# Altium footprint library IC.PCBLIB: 359 footprints (part 10 of 23)
Each footprint in its own frame and in the unit in brackets; x right, y up, seen from the top. Pads: shape width x height; smd on the part's side, far side on the other; paste and mask are expansions set on the pad; w line width, h text height; cw(c..) or ccw(c..) is an arc to the next point about the centre after c.
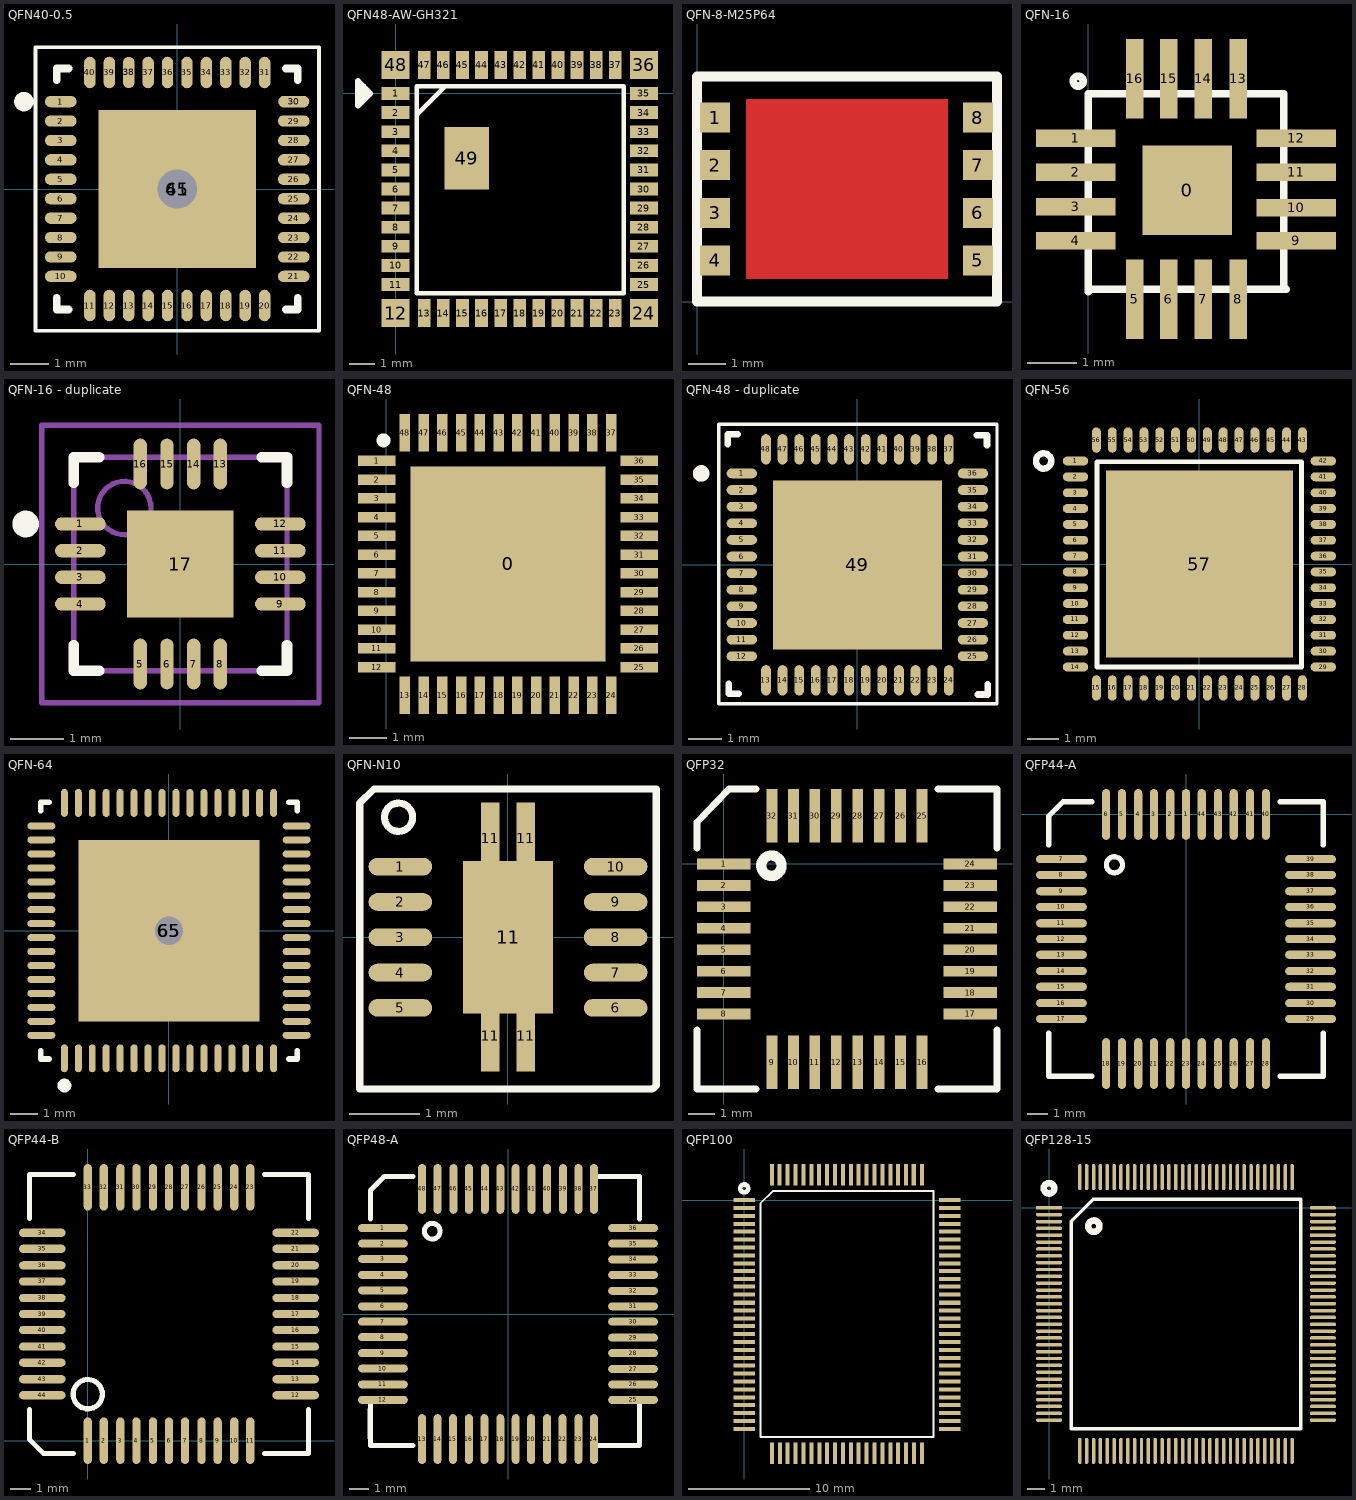
[diagram p9: the footprints below, top view; thin cyan lines are the x and y axes]

## QFN40-0.5 [mm]
pads (42):
  oval 0.813x0.292 smd: 1(-3,2.25) 2(-3,1.75) 3(-3,1.25) 4(-3,0.75) 5(-3,0.25) 6(-3,-0.25) 7(-3,-0.75) 8(-3,-1.25) 9(-3,-1.75) 10(-3,-2.25) 21(3,-2.25) 22(3,-1.75) 23(3,-1.25) 24(3,-0.75) 25(3,-0.25) 26(3,0.25) 27(3,0.75) 28(3,1.25) 29(3,1.75)
  oval 0.292x0.813 smd: 11(-2.25,-3) 12(-1.75,-3) 13(-1.25,-3) 14(-0.75,-3) 15(-0.25,-3) 16(0.25,-3) 17(0.75,-3) 18(1.25,-3) 19(1.75,-3) 20(2.25,-3) 31(2.25,3) 32(1.75,3) 33(1.25,3) 34(0.75,3) 35(0.25,3) 36(-0.25,3) 37(-0.75,3) 39(-1.75,3) 40(-2.25,3)
  oval 0.8x0.3 smd: 30(3,2.25)
  oval 0.3x0.8 smd: 38(-1.25,3)
  rect 4.064x4.064 smd: 41(0,0)
  oct 1.524x1.524 hole 1.016: 65(0,0)
TopOverlay:
  circle w0.25: c-3.95,2.25 r0.125
  lines w0.1: -3.65,-3.65 -3.65,3.65 3.65,3.65 3.65,-3.65 -3.65,-3.65
  lines w0.2: -3.1,-2.8 -3.1,-3.1 -2.8,-3.1 ; -3.1,2.8 -3.1,3.1 -2.8,3.1 ; 2.8,-3.1 3.1,-3.1 3.1,-2.8 ; 2.8,3.1 3.1,3.1 3.1,2.8
TopSolder:
  region: 1.016,0.508 1.016,-0.508 2.032,-0.508 2.032,0.508
  region: 0.508,-1.016 -0.508,-1.016 -0.508,-2.032 0.508,-2.032
  region: -1.016,-0.508 -1.016,0.508 -2.032,0.508 -2.032,-0.508
  rectangle: -0.508,1.016 0.508,2.032
  region: 0.711,2.032 0.711,0.711 2.032,0.711 2.032,2.032
  region: 2.032,-0.711 0.711,-0.711 0.711,-2.032 2.032,-2.032
  region: -0.711,-2.032 -0.711,-0.711 -2.032,-0.711 -2.032,-2.032
  rectangle: -2.032,0.711 -0.711,2.032

## QFN48-AW-GH321 [mm]
height 1.016
pads (49):
  rect 1.1x0.5 smd: 1(0,0) 2(0,-0.75) 3(0,-1.5) 4(0,-2.25) 5(0,-3) 6(0,-3.75) 7(0,-4.5) 8(0,-5.25) 9(0,-6) 10(0,-6.75) 11(0,-7.5) 25(9.75,-7.5) 26(9.75,-6.75) 27(9.75,-6) 28(9.75,-5.25) 29(9.75,-4.5) 30(9.75,-3.75) 31(9.75,-3) 32(9.75,-2.25) 33(9.75,-1.5) 34(9.75,-0.75) 35(9.75,0)
  rect 1.1x1.1 smd: 12(0,-8.625) 24(9.75,-8.625) 36(9.75,1.125) 48(0,1.125)
  rect 0.5x1.1 smd: 13(1.125,-8.625) 14(1.875,-8.625) 15(2.625,-8.625) 16(3.375,-8.625) 17(4.125,-8.625) 18(4.875,-8.625) 19(5.625,-8.625) 20(6.375,-8.625) 21(7.125,-8.625) 22(7.875,-8.625) 23(8.625,-8.625) 37(8.625,1.125) 38(7.875,1.125) 39(7.125,1.125) 40(6.375,1.125) 41(5.625,1.125) 42(4.875,1.125) 43(4.125,1.125) 44(3.375,1.125) 45(2.625,1.125) 46(1.875,1.125) 47(1.125,1.125)
  rect 1.75x2.47 smd: 49(2.797,-2.544)
TopOverlay:
  lines w0.178: -0.179,-8.55 0.075,-8.55 ; -0.179,1.05 0.074,1.05 ; 0.075,-8.804 0.075,-8.551 ; 0.075,1.05 0.075,1.304 ; 0.837,-0.831 1.956,0.288 ; 9.675,-8.804 9.675,-8.55 ; 9.675,1.051 9.929,1.051 ; 9.675,1.052 9.675,1.305 ; 9.676,-8.55 9.929,-8.55 ; 0.837,-7.84 8.965,-7.84 8.965,0.288 0.837,0.288 0.837,-7.84
  lines w0.229: -1.258,-0.215 -1.258,0.268 ; -1.473,-0.483 -1.473,0.483 -0.991,0 -1.473,-0.483

## QFN-8-M25P64 [mm]
pads (8):
  rect 0.8x0.8 smd: 1(0.484,4.905) 2(0.484,3.635) 3(0.484,2.365) 4(0.484,1.095) 5(7.493,1.095) 6(7.493,2.365) 7(7.493,3.635) 8(7.493,4.905)
TopLayer:
  rectangle: 1.3,0.6 6.7,5.4
TopOverlay:
  lines w0.254: 0,0 8,0 8,6 0,6 0,0

## QFN-16 [mm]
pads (17):
  rect 1.8x1.8 smd: 0(2,18.35)
  rect 1.6x0.35 smd: 1(-0.25,19.4) 2(-0.25,18.71) 3(-0.25,18.02) 4(-0.25,17.33) 9(4.2,17.33) 10(4.2,18) 11(4.2,18.71) 12(4.2,19.4)
  rect 0.35x1.6 smd: 5(0.94,16.15) 6(1.63,16.15) 7(2.32,16.15) 8(3.03,16.15) 13(3.03,20.6) 14(2.32,20.6) 15(1.63,20.6) 16(0.94,20.6)
TopOverlay:
  circle w0.152: c-0.2,20.55 r0.1
  lines w0.152: 0,16.3 0.05,16.35 4,16.35 3.95,16.4 3.95,20.3 0,20.3 0,16.3

## QFN-16 - duplicate [mm]
height 1
pads (17):
  oval 0.95x0.25 smd: 1(-1.875,0.75) 2(-1.875,0.25) 3(-1.875,-0.25) 4(-1.875,-0.75) 9(1.875,-0.75) 10(1.875,-0.25) 11(1.875,0.25) 12(1.875,0.75)
  oval 0.25x0.95 smd: 5(-0.75,-1.875) 6(-0.25,-1.875) 7(0.25,-1.875) 8(0.75,-1.875) 13(0.75,1.875) 14(0.25,1.875) 15(-0.25,1.875) 16(-0.75,1.875)
  rect 2x2 smd: 17(0,0)
TopOverlay:
  circle w0.25: c-2.9,0.75 r0.125
  lines w0.2: -2,-1.525 -2,-2 -1.525,-2 ; -2,1.525 -2,2 -1.525,2 ; 1.525,-2 2,-2 2,-1.525 ; 1.525,2 2,2 2,1.525
Mechanical13:
  circle w0.1: c-1.05,1.05 r0.5
  lines w0.1: -2,-2 2,-2 2,2 -2,2 -2,-2
Mechanical15:
  lines w0.1: -0.5,0 0.5,0 ; 0,-0.5 0,0.5 ; -2.6,-2.6 2.6,-2.6 2.6,2.6 -2.6,2.6 -2.6,-2.6
3D body: height 1, standoff 0.02, extent -2,-2 2,2

## QFN-48 [mm]
pads (49):
  rect 5.2x5.2 smd: 0(3.25,-8.25)
  rect 1x0.28 smd: 1(-0.25,-5.5) 2(-0.25,-6) 3(-0.25,-6.5) 4(-0.25,-7) 5(-0.25,-7.5) 6(-0.25,-8) 7(-0.25,-8.5) 8(-0.25,-9) 9(-0.25,-9.5) 10(-0.25,-10) 11(-0.25,-10.5) 12(-0.25,-11) 25(6.75,-11) 26(6.75,-10.5) 27(6.75,-10) 28(6.75,-9.5) 29(6.75,-9) 30(6.75,-8.5) 31(6.75,-8) 32(6.75,-7.5) 33(6.75,-7) 34(6.75,-6.5) 35(6.75,-6) 36(6.75,-5.5)
  rect 0.28x1 smd: 13(0.5,-11.75) 14(1,-11.75) 15(1.5,-11.75) 16(2,-11.75) 17(2.5,-11.75) 18(3,-11.75) 19(3.5,-11.75) 20(4,-11.75) 21(4.5,-11.75) 22(5,-11.75) 23(5.5,-11.75) 24(6,-11.75) 37(6,-4.75) 38(5.5,-4.75) 39(5,-4.75) 40(4.5,-4.75) 41(4,-4.75) 42(3.5,-4.75) 43(3,-4.75) 44(2.5,-4.75) 45(2,-4.75) 46(1.5,-4.75) 47(1,-4.75) 48(0.5,-4.75)
TopOverlay:
  circle w0.23: c-0.07,-4.953 r0.07

## QFN-48 - duplicate [mm]
pads (49):
  oval 0.913x0.292 smd: 1(-3.475,2.75) 2(-3.475,2.25) 3(-3.475,1.75) 4(-3.475,1.25) 5(-3.475,0.75) 6(-3.475,0.25) 7(-3.475,-0.25) 8(-3.475,-0.75) 9(-3.475,-1.25) 10(-3.475,-1.75) 11(-3.475,-2.25) 12(-3.475,-2.75) 25(3.475,-2.75) 26(3.475,-2.25) 27(3.475,-1.75) 28(3.475,-1.25) 29(3.475,-0.75) 30(3.475,-0.25) 31(3.475,0.25) 32(3.475,0.75) 33(3.475,1.25) 34(3.475,1.75) 35(3.475,2.25) 36(3.475,2.75)
  oval 0.292x0.913 smd: 13(-2.75,-3.475) 14(-2.25,-3.475) 15(-1.75,-3.475) 16(-1.25,-3.475) 17(-0.75,-3.475) 18(-0.25,-3.475) 19(0.25,-3.475) 20(0.75,-3.475) 21(1.25,-3.475) 22(1.75,-3.475) 23(2.25,-3.475) 24(2.75,-3.475) 37(2.75,3.475) 38(2.25,3.475) 39(1.75,3.475) 40(1.25,3.475) 41(0.75,3.475) 42(0.25,3.475) 43(-0.25,3.475) 44(-0.75,3.475) 45(-1.25,3.475) 46(-1.75,3.475) 47(-2.25,3.475) 48(-2.75,3.475)
  rect 5.08x5.08 smd: 49(0,0)
TopOverlay:
  circle w0.25: c-4.7,2.75 r0.125
  lines w0.1: -4.175,-4.175 -4.175,4.225 4.2,4.225 4.2,-4.175 -4.175,-4.175
  lines w0.2: -3.9,3.625 -3.9,3.925 -3.6,3.925 ; -3.875,-3.575 -3.875,-3.875 -3.575,-3.875 ; 3.6,3.9 3.9,3.9 3.9,3.6 ; 3.625,-3.9 3.925,-3.9 3.925,-3.6
TopSolder:
  rectangle: -0.762,-0.762 0.762,0.762
  rectangle: -2.54,-0.762 -1.016,0.762
  rectangle: -2.54,1.016 -1.016,2.54
  region: -1.016,-2.54 -1.016,-1.016 -2.54,-1.016 -2.54,-2.54
  region: 0.762,-2.54 0.762,-1.016 -0.762,-1.016 -0.762,-2.54
  region: 2.54,-1.016 1.016,-1.016 1.016,-2.54 2.54,-2.54
  region: 2.54,0.762 1.016,0.762 1.016,-0.762 2.54,-0.762
  region: 1.016,2.54 1.016,1.016 2.54,1.016 2.54,2.54
  region: -0.762,2.54 -0.762,1.016 0.762,1.016 0.762,2.54

## QFN-56 [mm]
pads (57):
  oval 0.8x0.28 smd: 1(-3.91,3.25) 2(-3.91,2.75) 3(-3.91,2.25) 4(-3.91,1.75) 5(-3.91,1.25) 6(-3.91,0.75) 7(-3.91,0.25) 8(-3.91,-0.25) 9(-3.91,-0.75) 10(-3.91,-1.25) 11(-3.91,-1.75) 12(-3.91,-2.25) 13(-3.91,-2.75) 14(-3.91,-3.25) 29(3.91,-3.25) 30(3.91,-2.75) 31(3.91,-2.25) 32(3.91,-1.75) 33(3.91,-1.25) 34(3.91,-0.75) 35(3.91,-0.25) 36(3.91,0.25) 37(3.91,0.75) 38(3.91,1.25) 39(3.91,1.75) 40(3.91,2.25) 41(3.91,2.75) 42(3.91,3.25)
  oval 0.28x0.8 smd: 15(-3.25,-3.91) 16(-2.75,-3.91) 17(-2.25,-3.91) 18(-1.75,-3.91) 19(-1.25,-3.91) 20(-0.75,-3.91) 21(-0.25,-3.91) 22(0.25,-3.91) 23(0.75,-3.91) 24(1.25,-3.91) 25(1.75,-3.91) 26(2.25,-3.91) 27(2.75,-3.91) 28(3.25,-3.91) 43(3.25,3.91) 44(2.75,3.91) 45(2.25,3.91) 46(1.75,3.91) 47(1.25,3.91) 48(0.75,3.91) 49(0.25,3.91) 50(-0.25,3.91) 51(-0.75,3.91) 52(-1.25,3.91) 53(-1.75,3.91) 54(-2.25,3.91) 55(-2.75,3.91) 56(-3.25,3.91)
  rect 5.9x5.9 smd: 57(0,0)
TopOverlay:
  circle w0.203: c-4.915,3.251 r0.241
  lines w0.152: -3.226,-3.251 3.226,-3.251 3.226,3.226 -3.226,3.226 -3.226,-3.251

## QFN-64 [mm]
height 1.016
pads (66):
  oval 0.25x1 smd: 1(-3.75,-4.575) 2(-3.25,-4.575) 3(-2.75,-4.575) 4(-2.25,-4.575) 5(-1.75,-4.575) 6(-1.25,-4.575) 7(-0.75,-4.575) 8(-0.25,-4.575) 9(0.25,-4.575) 10(0.75,-4.575) 11(1.25,-4.575) 12(1.75,-4.575) 13(2.25,-4.575) 14(2.75,-4.575) 15(3.25,-4.575) 16(3.75,-4.575) 33(3.75,4.575) 34(3.25,4.575) 35(2.75,4.575) 36(2.25,4.575) 37(1.75,4.575) 38(1.25,4.575) 39(0.75,4.575) 40(0.25,4.575) 41(-0.25,4.575) 42(-0.75,4.575) 43(-1.25,4.575) 44(-1.75,4.575) 45(-2.25,4.575) 46(-2.75,4.575) 47(-3.25,4.575) 48(-3.75,4.575)
  oval 1x0.25 smd: 17(4.575,-3.75) 18(4.575,-3.25) 19(4.575,-2.75) 20(4.575,-2.25) 21(4.575,-1.75) 22(4.575,-1.25) 23(4.575,-0.75) 24(4.575,-0.25) 25(4.575,0.25) 26(4.575,0.75) 27(4.575,1.25) 28(4.575,1.75) 29(4.575,2.25) 30(4.575,2.75) 31(4.575,3.25) 32(4.575,3.75) 49(-4.575,3.75) 50(-4.575,3.25) 51(-4.575,2.75) 52(-4.575,2.25) 53(-4.575,1.75) 54(-4.575,1.25) 55(-4.575,0.75) 56(-4.575,0.25) 57(-4.575,-0.25) 58(-4.575,-0.75) 59(-4.575,-1.25) 60(-4.575,-1.75) 61(-4.575,-2.25) 62(-4.575,-2.75) 63(-4.575,-3.25) 64(-4.575,-3.75)
  oct 1.524x1.524 hole 1.016: 65(0,0)
  rect 6.5x6.5 smd: 65(0,0)
TopOverlay:
  circle w0.25: c-3.75,-5.55 r0.125
  lines w0.2: -4.6,-4.3 -4.6,-4.6 -4.3,-4.6 ; -4.6,4.3 -4.6,4.6 -4.3,4.6 ; 4.3,-4.6 4.6,-4.6 4.6,-4.3 ; 4.3,4.6 4.6,4.6 4.6,4.3
TopSolder:
  rectangle: -3.251,0.762 -0.762,3.251
  region: -0.762,-3.251 -0.762,-0.762 -3.251,-0.762 -3.251,-3.251
  region: 3.251,-0.762 0.762,-0.762 0.762,-3.251 3.251,-3.251
  region: 0.762,3.251 0.762,0.762 3.251,0.762 3.251,3.251
  rectangle: -0.381,1.016 0.381,3.251
  region: -1.016,-0.381 -1.016,0.381 -3.251,0.381 -3.251,-0.381
  region: 0.381,-1.016 -0.381,-1.016 -0.381,-3.251 0.381,-3.251
  region: 1.016,0.381 1.016,-0.381 3.251,-0.381 3.251,0.381

## QFN-N10 [mm]
height 1.2
pads (15):
  oval 0.9x0.25 smd: 1(-1.525,0.997) 2(-1.525,0.497) 3(-1.525,-0.003) 4(-1.525,-0.503) 5(-1.525,-1.003) 6(1.525,-1.003) 7(1.525,-0.503) 8(1.525,-0.003) 9(1.525,0.497) 10(1.525,0.997)
  rect 0.26x1.016 smd: 11(-0.25,-1.4) 11(-0.25,1.4) 11(0.25,-1.4) 11(0.25,1.4)
  rect 1.27x2.159 smd paste+0: 11(0,-0.003)
TopOverlay:
  circle w0.1: c-1.55,1.697 r0.2
  lines w0.1: -2.1,-2.153 -2.1,-1.103 -2.1,1.897 -1.9,2.097 0.65,2.097 2.1,2.097 2.1,-1.353 2.1,-2.103 2.05,-2.153 -2.1,-2.153

## QFP32 [mm]
pads (32):
  rect 2x0.4 smd: 1(0,0) 2(0,-0.8) 3(0,-1.6) 4(0,-2.4) 5(0,-3.2) 6(0,-4) 7(0,-4.8) 8(0,-5.6) 17(9.2,-5.6) 18(9.2,-4.8) 19(9.2,-4) 20(9.2,-3.2) 21(9.2,-2.4) 22(9.2,-1.6) 23(9.2,-0.8) 24(9.2,0)
  rect 0.4x2 smd: 9(1.8,-7.4) 10(2.6,-7.4) 11(3.4,-7.4) 12(4.2,-7.4) 13(5,-7.4) 14(5.8,-7.4) 15(6.6,-7.4) 16(7.4,-7.4) 25(7.4,1.8) 26(6.6,1.8) 27(5.8,1.8) 28(5,1.8) 29(4.2,1.8) 30(3.4,1.8) 31(2.6,1.8) 32(1.8,1.8)
TopOverlay:
  circle w0.381: c1.777,-0.063 r0.381
  lines w0.254: -1,-6.2 -1,-8.4 1.2,-8.4 ; -1,0.6 -1,1.556 0.19,2.8 1.2,2.8 ; 8,-8.4 10.2,-8.4 10.2,-6.2 ; 8,2.8 10.2,2.8 10.2,0.6

## QFP44-A [mil]
pads (44):
  oval 16x100 smd: 1(0,0) 2(-31,0) 3(-63,0) 4(-94,0) 5(-126,0) 6(-157,0) 18(-157,-490) 19(-126,-490) 20(-94,-490) 21(-63,-490) 22(-31,-490) 23(0,-490) 24(31,-490) 25(63,-490) 26(94,-490) 27(126,-490) 28(157,-490) 40(157,0) 41(126,0) 42(94,0) 43(63,0) 44(31,0)
  oval 100x16 smd: 7(-245,-88) 8(-245,-119) 9(-245,-151) 10(-245,-182) 11(-245,-214) 12(-245,-245) 13(-245,-276) 14(-245,-308) 15(-245,-339) 16(-245,-371) 17(-245,-402) 29(245,-402) 30(245,-371) 31(245,-339) 32(245,-308) 33(245,-276) 34(245,-245) 35(245,-214) 36(245,-182) 37(245,-151) 38(245,-119) 39(245,-88)
TopOverlay:
  circle w10: c-140.81,-99 r15.81
  lines w10: -270,-430 -270,-515 -185,-515 ; -270,-60 -270,-3 -242,25 -185,25 ; 185,-515 270,-515 270,-430 ; 185,25 270,25 270,-60

## QFP44-B [mil]
pads (44):
  oval 16x90 smd: 1(0,0) 2(31,0) 3(63,0) 4(94,0) 5(126,0) 6(157,0) 7(188,0) 8(220,0) 9(251,0) 10(283,0) 11(314,0) 23(314,490) 24(283,490) 25(251,490) 26(220,490) 27(188,490) 28(157,490) 29(126,490) 30(94,490) 31(63,490) 32(31,490) 33(0,490)
  oval 90x16 smd: 12(402,88) 13(402,119) 14(402,151) 15(402,182) 16(402,214) 17(402,245) 18(402,276) 19(402,308) 20(402,339) 21(402,371) 22(402,402) 34(-88,402) 35(-88,371) 36(-88,339) 37(-88,308) 38(-88,276) 39(-88,245) 40(-88,214) 41(-88,182) 42(-88,151) 43(-88,119) 44(-88,88)
TopOverlay:
  circle w10: c0,90 r28.28
  lines w10: -113,60 -113,3 -85,-25 -28,-25 ; -113,430 -113,515 -28,515 ; 342,-25 427,-25 427,60 ; 342,515 427,515 427,430

## QFP48-A [mil]
pads (48):
  oval 100x16 smd: 1(-251.24,172.5) 2(-251.24,141.5) 3(-251.24,110.5) 4(-251.24,78.5) 5(-251.24,47.5) 6(-251.24,15.5) 7(-251.24,-15.5) 8(-251.24,-46.5) 9(-251.24,-78.5) 10(-251.24,-109.5) 11(-251.24,-141.5) 12(-251.24,-172.5) 25(251.24,-172.5) 26(251.24,-141.5) 27(251.24,-110.5) 28(251.24,-78.5) 29(251.24,-47.5) 30(251.24,-15.5) 31(251.24,15.5) 32(251.24,46.5) 33(251.24,78.5) 34(251.24,109.5) 35(251.24,141.5) 36(251.24,172.5)
  oval 16x100 smd: 13(-172.5,-251.24) 14(-141.5,-251.24) 15(-110.5,-251.24) 16(-78.5,-251.24) 17(-47.5,-251.24) 18(-15.5,-251.24) 19(15.5,-251.24) 20(46.5,-251.24) 21(78.5,-251.24) 22(109.5,-251.24) 23(141.5,-251.24) 24(172.5,-251.24) 37(172.5,251.24) 38(141.5,251.24) 39(110.5,251.24) 40(78.5,251.24) 41(47.5,251.24) 42(15.5,251.24) 43(-15.5,251.24) 44(-46.5,251.24) 45(-78.5,251.24) 46(-109.5,251.24) 47(-141.5,251.24) 48(-172.5,251.24)
TopOverlay:
  circle w10: c-152.05,166.24 r15.81
  lines w10: -276.24,-178.76 -276.24,-263.76 -191.24,-263.76 ; 178.76,-263.76 263.76,-263.76 263.76,-178.76 ; 178.76,276.24 263.76,276.24 263.76,191.24 ; -276.24,248.24 -276.24,191.24 -276.24,248.24 ; -276.24,248.24 -248.24,276.24 ; -248.24,276.24 -191.24,276.24 -248.24,276.24 ; -276.98,-248.76 -276.98,-191.76 -276.98,-248.76

## QFP100 [mil]
pads (100):
  rect 70x13 smd: 1(0,0) 2(0,-26) 3(0,-51) 4(0,-77) 5(0,-102) 6(0,-128) 7(0,-154) 8(0,-179) 9(0,-205) 10(0,-230) 11(0,-256) 12(0,-281) 13(0,-307) 14(0,-333) 15(0,-358) 16(0,-384) 17(0,-409) 18(0,-435) 19(0,-461) 20(0,-486) 21(0,-512) 22(0,-537) 23(0,-563) 24(0,-589) 25(0,-614) 26(0,-640) 27(0,-665) 28(0,-691) 29(0,-717) 30(0,-742) 51(667,-742) 52(667,-717) 53(667,-691) 54(667,-665) 55(667,-640) 56(667,-614) 57(667,-589) 58(667,-563) 59(667,-537) 60(667,-512) 61(667,-486) 62(667,-461) 63(667,-435) 64(667,-409) 65(667,-384) 66(667,-358) 67(667,-333) 68(667,-307) 69(667,-281) 70(667,-256) 71(667,-230) 72(667,-205) 73(667,-179) 74(667,-154) 75(667,-128) 76(667,-102) 77(667,-77) 78(667,-51) 79(667,-26) 80(667,0)
  rect 13x70 smd: 31(90,-821) 32(116,-821) 33(141,-821) 34(167,-821) 35(192,-821) 36(218,-821) 37(244,-821) 38(269,-821) 39(295,-821) 40(320,-821) 41(346,-821) 42(371,-821) 43(397,-821) 44(423,-821) 45(448,-821) 46(474,-821) 47(499,-821) 48(525,-821) 49(551,-821) 50(576,-821) 81(576,82) 82(550,82) 83(525,82) 84(499,82) 85(474,82) 86(448,82) 87(422,82) 88(397,82) 89(371,82) 90(346,82) 91(320,82) 92(295,82) 93(269,82) 94(243,82) 95(218,82) 96(192,82) 97(167,82) 98(141,82) 99(115,82) 100(90,82)
TopOverlay:
  circle w15: c0,38 r12.81
  lines w6: 614,-768 53,-768 53,-11 93,29 614,29 ; 614.05,-768.05 614.05,29.05

## QFP128-15 [mil]
pads (128):
  rect 60x8 smd: 1(0,0)
  oval 60x8 smd: 2(0,-15.75) 3(0,-31.5) 4(0,-47.24) 5(0,-62.99) 6(0,-78.74) 7(0,-94.49) 8(0,-110.24) 9(0,-125.98) 10(0,-141.73) 11(0,-157.48) 12(0,-173.23) 13(0,-188.98) 14(0,-204.72) 15(0,-220.47) 16(0,-236.22) 17(0,-251.97) 18(0,-267.72) 19(0,-283.46) 20(0,-299.21) 21(0,-314.96) 22(0,-330.71) 23(0,-346.46) 24(0,-362.2) 25(0,-377.95) 26(0,-393.7) 27(0,-409.45) 28(0,-425.2) 29(0,-440.94) 30(0,-456.69) 31(0,-472.44) 32(0,-488.19) 65(629.92,-488.19) 66(629.92,-472.44) 67(629.92,-456.69) 68(629.92,-440.94) 69(629.92,-425.2) 70(629.92,-409.45) 71(629.92,-393.7) 72(629.92,-377.95) 73(629.92,-362.2) 74(629.92,-346.46) 75(629.92,-330.71) 76(629.92,-314.96) 77(629.92,-299.21) 78(629.92,-283.46) 79(629.92,-267.72) 80(629.92,-251.97) 81(629.92,-236.22) 82(629.92,-220.47) 83(629.92,-204.72) 84(629.92,-188.98) 85(629.92,-173.23) 86(629.92,-157.48) 87(629.92,-141.73) 88(629.92,-125.98) 89(629.92,-110.24) 90(629.92,-94.49) 91(629.92,-78.74) 92(629.92,-62.99) 93(629.92,-47.24) 94(629.92,-31.5) 95(629.92,-15.75) 96(629.92,0)
  oval 8x60 smd: 33(70.87,-559.05) 34(86.61,-559.05) 35(102.36,-559.05) 36(118.11,-559.05) 37(133.86,-559.05) 38(149.61,-559.05) 39(165.35,-559.05) 40(181.1,-559.05) 41(196.85,-559.05) 42(212.6,-559.05) 43(228.35,-559.05) 44(244.09,-559.05) 45(259.84,-559.05) 46(275.59,-559.05) 47(291.34,-559.05) 48(307.09,-559.05) 49(322.83,-559.05) 50(338.58,-559.05) 51(354.33,-559.05) 52(370.08,-559.05) 53(385.83,-559.05) 54(401.57,-559.05) 55(417.32,-559.05) 56(433.07,-559.05) 57(448.82,-559.05) 58(464.57,-559.05) 59(480.31,-559.05) 60(496.06,-559.05) 61(511.81,-559.05) 62(527.56,-559.05) 63(543.31,-559.05) 64(559.05,-559.05) 97(559.05,70.87) 98(543.31,70.87) 99(527.56,70.87) 100(511.81,70.87) 101(496.06,70.87) 102(480.31,70.87) 103(464.57,70.87) 104(448.82,70.87) 105(433.07,70.87) 106(417.32,70.87) 107(401.57,70.87) 108(385.83,70.87) 109(370.08,70.87) 110(354.33,70.87) 111(338.58,70.87) 112(322.83,70.87) 113(307.09,70.87) 114(291.34,70.87) 115(275.59,70.87) 116(259.84,70.87) 117(244.09,70.87) 118(228.35,70.87) 119(212.6,70.87) 120(196.85,70.87) 121(181.1,70.87) 122(165.35,70.87) 123(149.61,70.87) 124(133.86,70.87) 125(118.11,70.87) 126(102.36,70.87) 127(86.61,70.87) 128(70.87,70.87)
TopOverlay:
  circle w15: c-0.03,45 r12.01
  circle w15: c102.97,-42 r12.97
  lines w7.87: 50.59,-508.46 50.59,-30.31 101.18,20.28 579.33,20.28 579.33,-508.46 50.59,-508.46